# Altium footprint library ic.PcbLib: 116 footprints (part 1 of 8)
Each footprint in its own frame and in the unit in brackets; x right, y up, seen from the top. Pads: shape width x height; smd on the part's side, far side on the other; paste and mask are expansions set on the pad; w line width, h text height; cw(c..) or ccw(c..) is an arc to the next point about the centre after c.
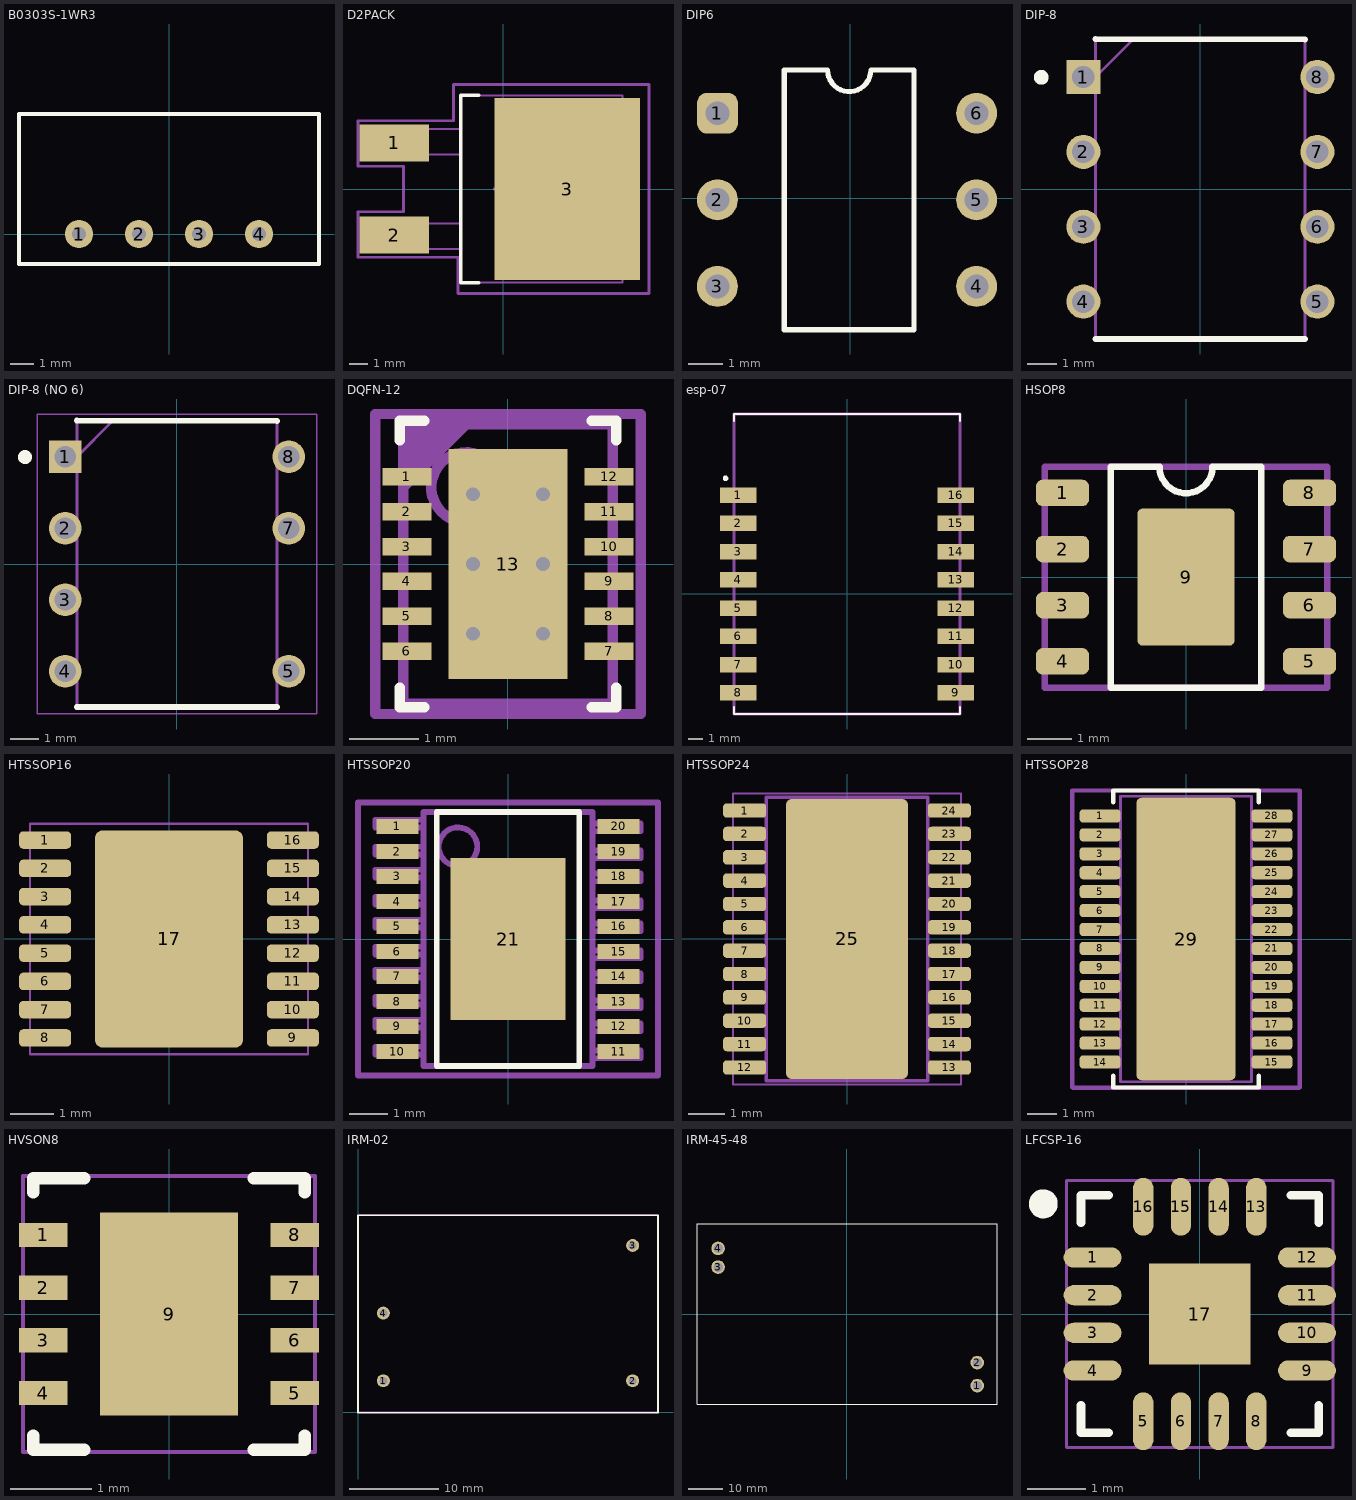
[diagram p0: the footprints below, top view; thin cyan lines are the x and y axes]

## B0303S-1WR3 [mm]
pads (4):
  round 1.2 hole 0.6: 1(-3.81,0) 2(-1.27,0) 3(1.27,0) 4(3.81,0)
Top Overlay:
  lines w0.15: -6.35,-1.27 6.35,-1.27 6.35,5.08 -6.35,5.08 -6.35,-1.27
3D body: height 10.2, standoff 0, extent -6.35,-1.27 6.35,5.08

## D2PACK [mm]
pads (3):
  rect 3.81x2.03 smd: 1(-6,2.54) 2(-6,-2.54)
  rect 8x10 smd: 3(3.5,0)
Top Overlay:
  lines w0.2: -1.35,-5.15 -2.35,-5.15 -2.35,5.15 -1.35,5.15
  text "." at -6.85,4.8 h0.1
Top Courtyard:
  lines w0.15: -8,-3.75 -8,-1.25 -5.5,-1.25 -5.5,1.25 -8,1.25 -8,3.75 -2.75,3.75 -2.75,5.75 8,5.75 8,-5.75 -2.5,-5.75 -2.5,-3.75 -8,-3.75
M15:
  lines w0.15: -0.5,0 0.5,0 ; 0,-0.5 0,0.5
Mechanical 29:
  lines w0.1: -2.35,-3.3 -6.9,-3.3 -6.9,-3 -6.9,-1.9 -2.35,-1.9 ; -2.35,1.9 -6.9,1.9 -6.9,2.2 -6.9,3.3 -2.35,3.3 ; -2.35,-5.15 6.55,-5.15 6.55,5.15 -2.35,5.15 -2.35,-5.15
  text ".Designator" at -1.25,-0.3 h1
3D body "D2-PAK.step": height 4.82, standoff 0, extent -7.405,-5.15 7.845,5.15

## DIP6 [mm]
pads (6):
  rrect50% 1.2x1.2 hole 0.7: 1(-3.9,2.5)
  round 1.2 hole 0.7: 2(-3.9,-0.04) 3(-3.9,-2.58) 4(3.7,-2.58) 5(3.7,-0.04) 6(3.7,2.5)
Top Overlay:
  lines w0.15: -1.941,-3.85 -1.941,3.77 -0.671,3.77 ccw(c-0.036,3.77) 0.599,3.77 1.869,3.77 1.869,-3.85 -1.941,-3.85
  text "." at -3.6,3.8 h0.1
3D body "User Library-DIP6.STEP": height 4.8, standoff -2.5, extent -4.035,-3.6 3.835,3.52

## DIP-8 [mm]
pads (8):
  rect 1.16x1.16 hole 0.76: 1(-3.97,3.81)
  round 1.16 hole 0.76: 2(-3.97,1.27) 3(-3.97,-1.27) 4(-3.97,-3.81) 5(3.97,-3.81) 6(3.97,-1.27) 7(3.97,1.27) 8(3.97,3.81)
Top Overlay:
  circle w0.25: c-5.4,3.8 r0.125
  lines w0.2: -3.555,-5.08 3.555,-5.08 ; -3.555,5.1 3.555,5.08
Mechanical 13:
  lines w0.1: -3.555,3.81 -2.285,5.08 ; -3.555,-5.08 -3.555,5.08 3.555,5.08 3.555,-5.08 -3.555,-5.08
3D body "ADM1485ANZ.stp": height 5.33, standoff -3.5, extent -4.11,-4.795 4.11,4.795

## DIP-8 (NO 6) [mm]
pads (7):
  rect 1.16x1.16 hole 0.76: 1(-3.97,3.81)
  round 1.16 hole 0.76: 2(-3.97,1.27) 3(-3.97,-1.27) 4(-3.97,-3.81) 5(3.97,-3.81) 7(3.97,1.27) 8(3.97,3.81)
Top Overlay:
  circle w0.25: c-5.4,3.8 r0.125
  lines w0.2: -3.555,-5.08 3.555,-5.08 ; -3.555,5.1 3.555,5.08
Mechanical 13:
  lines w0.1: -3.555,3.81 -2.285,5.08 ; -3.555,-5.08 3.555,-5.08 3.555,5.08 -3.555,5.08 -3.555,-5.08
M15:
  lines w0.05: -4.96,-5.33 4.96,-5.33 4.96,5.33 -4.96,5.33 -4.96,-5.33
3D body "ADM1485ANZ.stp": height 5.33, standoff -3.5, extent -4.11,-4.795 4.11,4.795

## DQFN-12 [mm] "SON, 12-Leads, Body 4x3mm, Pitch 0.5mm, Thermal Pad 3.3x1.7mm"
height 0.8
pads (13):
  rect 0.7x0.25 smd: 1(-1.45,1.25) 2(-1.45,0.75) 3(-1.45,0.25) 4(-1.45,-0.25) 5(-1.45,-0.75) 6(-1.45,-1.25) 7(1.45,-1.25) 8(1.45,-0.75) 9(1.45,-0.25) 10(1.45,0.25) 11(1.45,0.75) 12(1.45,1.25)
  rect 1.7x3.3 smd: 13(0,0)
via -0.5,1 diameter 0.5 hole 0.2
via 0.5,1 diameter 0.5 hole 0.2
via -0.5,0 diameter 0.5 hole 0.2
via 0.5,0 diameter 0.5 hole 0.2
via -0.5,-1 diameter 0.5 hole 0.2
via 0.5,-1 diameter 0.5 hole 0.2
Top Overlay:
  lines w0.15: -1.55,-1.775 -1.55,-2.05 -1.2,-2.05 ; -1.55,1.775 -1.55,2.05 -1.2,2.05 ; 1.2,-2.05 1.55,-2.05 1.55,-1.775 ; 1.2,2.05 1.55,2.05 1.55,1.775
  text "." at -2.032,1.943 h0.1
Top Courtyard:
  lines w0.15: -0.5,0 0.5,0 ; 0,-0.5 0,0.5 ; -1.9,-2.15 -1.9,2.15 1.9,2.15 1.9,-2.15 -1.9,-2.15
Mechanical 13:
  circle w0.15: c-0.6,1.1 r0.5
Mechanical 29:
  region: -1.5,1 -1.5,2 -0.5,2
  lines w0.15: -1.5,-2 -1.5,2 ; -1.5,-2 1.5,-2 ; -1.5,-2 1.5,-2 ; -1.5,-2 -1.5,2 ; -1.5,2 1.5,2 ; -1.5,2 1.5,2 ; 1.5,-2 1.5,2 ; 1.5,-2 1.5,2
  text ".Designator" at -1.4,-0.5 h1
3D body: height 0.8, standoff 0, extent -1.5,-2 1.5,2

## esp-07 [mm]
pads (16):
  rect 2.6x1.1 smd: 1(-7.7,7) 2(-7.7,5) 3(-7.7,3) 4(-7.7,1) 5(-7.7,-1) 6(-7.7,-3) 7(-7.7,-5) 8(-7.7,-7) 9(7.7,-7) 10(7.7,-5) 11(7.7,-3) 12(7.7,-1) 13(7.7,1) 14(7.7,3) 15(7.7,5) 16(7.7,7)
Top Overlay:
  lines w0.15: -8,-8 -8,-8.5 8,-8.5 8,-8 ; -8,12.25 -8,12.75 8,12.75 8,12.25
  lines w0.2: -8.6,8.1 cw(c-8.6,8.2) -8.6,8.3 ; -8.552,8.288 ccw(c-8.6,8.2) -8.5,8.2
Mechanical 13:
  lines w0.2: -8,-8.5 -8,12.75 8,12.75 8,-8.5 -8,-8.5
3D body "ESP8266-ESP07.STEP": height 2.2, standoff -0.01, extent -8,-8 8,12

## HSOP8 [mm]
pads (9):
  rrect50% 1.2x0.6 smd: 1(-2.794,1.905) 2(-2.794,0.635) 3(-2.794,-0.635) 4(-2.794,-1.905) 5(2.794,-1.905) 6(2.794,-0.635) 7(2.794,0.635) 8(2.794,1.905)
  rrect10% 2.2x3.1 smd: 9(0,0)
Top Overlay:
  lines w0.15: -1.7,-2.5 0,-2.5 1.7,-2.5 1.7,2.5 0.6,2.5 cw(c0,2.5) -0.6,2.5 -1.7,2.5 -1.7,-2.5
  text "." at -2.85,2.705 h0.1
Top Courtyard:
  lines w0.15: -3.2,-2.5 3.2,-2.5 3.2,2.5 -3.2,2.5 -3.2,-2.5
3D body "User Library-so8-4.STEP": height 1.76, standoff 0, extent -3.068,-2.445 3.068,2.445

## HTSSOP16 [mm] "TSOP, 16-Leads, Body 5,00x4,40mm, Pitch 0,65mm, Thermal Pad 5,00x3,40mm, IPC High Density"
height 1.2
pads (17):
  rrect50% 1.2x0.4 smd: 1(-2.85,2.275) 2(-2.85,1.625) 3(-2.85,0.975) 4(-2.85,0.325) 5(-2.85,-0.325) 6(-2.85,-0.975) 7(-2.85,-1.625) 8(-2.85,-2.275) 9(2.85,-2.275) 10(2.85,-1.625) 11(2.85,-0.975) 12(2.85,-0.325) 13(2.85,0.325) 14(2.85,0.975) 15(2.85,1.625) 16(2.85,2.275)
  rrect10% 3.4x5 smd mask+0.102: 17(0,0)
Top Overlay:
  text "." at -2.859,3.03 h0.1
Top Solder:
  rectangle: -1.5,-1.5 1.5,1.5
Top Courtyard:
  lines w0.05: -3.2,-2.65 -3.2,2.65 3.2,2.65 3.2,-2.65 -3.2,-2.65
3D body "HTSSOP16.step": height 1.2, standoff 0, extent -3.2,-2.55 3.2,2.55

## HTSSOP20 [mm] "TSSOP, 20-Leads, Body 6,50x4,40mm, Pitch 0,65mm, IPC Medium Density"
height 1.2
pads (21):
  rect 1.1x0.4 smd: 1(-2.875,2.925) 2(-2.875,2.275) 3(-2.875,1.625) 4(-2.875,0.975) 5(-2.875,0.325) 6(-2.875,-0.325) 7(-2.875,-0.975) 8(-2.875,-1.625) 9(-2.875,-2.275) 10(-2.875,-2.925) 11(2.875,-2.925) 12(2.875,-2.275) 13(2.875,-1.625) 14(2.875,-0.975) 15(2.875,-0.325) 16(2.875,0.325) 17(2.875,0.975) 18(2.875,1.625) 19(2.875,2.275) 20(2.875,2.925)
  rect 3x4.2 smd: 21(0,0)
Top Overlay:
  lines w0.15: -1.85,-3.3 1.85,-3.3 1.85,3.3 -1.85,3.3 -1.85,-3.3
  text "." at -2.921,3.721 h0.1
Top Courtyard:
  lines w0.15: -0.5,0 0.5,0 ; 0,-0.5 0,0.5 ; -3.9,-3.55 3.9,-3.55 3.9,3.55 -3.9,3.55 -3.9,-3.55
Mechanical 29:
  circle w0.15: c-1.3,2.4 r0.5
  lines w0.15: -2.2,-3 -3.45,-3 -3.45,-2.8 -2.2,-2.8 ; -2.2,-2.3 -3.45,-2.3 -3.45,-2.1 -2.2,-2.1 ; -2.2,-1.7 -3.45,-1.7 -3.45,-1.5 -2.2,-1.5 ; -2.2,-1 -3.45,-1 -3.45,-0.8 -2.2,-0.8 ; -2.2,-0.4 -3.45,-0.4 -3.45,-0.2 -2.2,-0.2 ; -2.2,0.3 -3.45,0.3 -3.45,0.5 -2.2,0.5 ; -2.2,0.9 -3.45,0.9 -3.45,1.1 -2.2,1.1 ; -2.2,1.6 -3.45,1.6 -3.45,1.8 -2.2,1.8 ; -2.2,2.2 -3.45,2.2 -3.45,2.4 -2.2,2.4 ; -2.2,2.9 -3.45,2.9 -3.45,3.1 -2.2,3.1 ; 2.2,-3.1 3.45,-3.1 3.45,-2.9 2.2,-2.9 ; 2.2,-2.4 3.45,-2.4 3.45,-2.2 2.2,-2.2 ; 2.2,-1.8 3.45,-1.8 3.45,-1.6 2.2,-1.6 ; 2.2,-1.1 3.45,-1.1 3.45,-0.9 2.2,-0.9 ; 2.2,-0.5 3.45,-0.5 3.45,-0.3 2.2,-0.3 ; 2.2,0.2 3.45,0.2 3.45,0.4 2.2,0.4 ; 2.2,0.8 3.45,0.8 3.45,1 2.2,1 ; 2.2,1.5 3.45,1.5 3.45,1.7 2.2,1.7 ; 2.2,2.1 3.45,2.1 3.45,2.3 2.2,2.3 ; 2.2,2.8 3.45,2.8 3.45,3 2.2,3 ; -2.2,-3.3 2.2,-3.3 2.2,3.3 -2.2,3.3 -2.2,-3.3
  text ".Designator" at -3.3,3.6 h1
3D body "TSSOP-20.step": height 1.2, standoff 0, extent -3.2,-3.3 3.2,3.3

## HTSSOP24 [mm] "TSOP, 24-Leads, Body 7,80x4,40mm, Pitch 0,65mm, Thermal Pad 7,80x3,40mm, IPC High Density"
height 1.2
pads (25):
  rrect50% 1.2x0.4 smd: 1(-2.85,3.575) 2(-2.85,2.925) 3(-2.85,2.275) 4(-2.85,1.625) 5(-2.85,0.975) 6(-2.85,0.325) 7(-2.85,-0.325) 8(-2.85,-0.975) 9(-2.85,-1.625) 10(-2.85,-2.275) 11(-2.85,-2.925) 12(-2.85,-3.575) 13(2.85,-3.575) 14(2.85,-2.925) 15(2.85,-2.275) 16(2.85,-1.625) 17(2.85,-0.975) 18(2.85,-0.325) 19(2.85,0.325) 20(2.85,0.975) 21(2.85,1.625) 22(2.85,2.275) 23(2.85,2.925) 24(2.85,3.575)
  rrect10% 3.4x7.8 smd mask+0: 25(0,0)
Top Overlay:
  text "." at -2.921,4.229 h0.1
Top Solder:
  rectangle: -1.2,-2.6 1.2,2.6
Top Courtyard:
  lines w0.05: -3.175,-4.05 3.175,-4.05 3.175,4.05 -3.175,4.05 -3.175,-4.05
Mechanical 13:
  lines w0.1: -2.25,-3.95 2.25,-3.95 2.25,3.95 -2.25,3.95 -2.25,-3.95
3D body "HTSSOP24.step": height 1.2, standoff 0, extent -3.2,-3.95 3.2,3.95

## HTSSOP28 [mm] "HTSSOP-28, 28-Leads, Body 9,70x4,40mm, Pitch 0,65mm, Thermal Pad 9,70x3,40mm, IPC Medium Density"
height 1.2
pads (29):
  rrect50% 1.4x0.45 smd: 1(-2.95,4.225) 2(-2.95,3.575) 3(-2.95,2.925) 4(-2.95,2.275) 5(-2.95,1.625) 6(-2.95,0.975) 7(-2.95,0.325) 8(-2.95,-0.325) 9(-2.95,-0.975) 10(-2.95,-1.625) 11(-2.95,-2.275) 12(-2.95,-2.925) 13(-2.95,-3.575) 14(-2.95,-4.225) 15(2.95,-4.225) 16(2.95,-3.575) 17(2.95,-2.925) 18(2.95,-2.275) 19(2.95,-1.625) 20(2.95,-0.975) 21(2.95,-0.325) 22(2.95,0.325) 23(2.95,0.975) 24(2.95,1.625) 25(2.95,2.275) 26(2.95,2.925) 27(2.95,3.575) 28(2.95,4.225)
  rrect10% 3.4x9.7 smd mask+0: 29(0,0)
Top Overlay:
  lines w0.15: -2.5,-4.7 -2.5,-5.1 2.5,-5.1 2.5,-4.7 ; -2.5,4.7 -2.5,5.1 2.5,5.1 2.5,4.7
  text "." at -3.048,4.991 h0.1
Top Solder:
  rectangle: -1.8,-2.6 1.8,2.6
Top Courtyard:
  lines w0.1: -2.25,-4.9 -2.25,4.9 2.25,4.9 2.25,-4.9 -2.25,-4.9
  lines w0.15: -0.8,0 0,0 ; -3.9,-5.1 3.9,-5.1 3.9,5.1 -3.9,5.1 -3.9,-5.1
Top 3D Body:
  lines w0.05: -3.9,-5.15 -3.9,5.15 3.9,5.15 3.9,-5.15 -3.9,-5.15
3D body "HTSSOP-28.step": height 1.2, standoff 0, extent -3.2,-4.9 3.2,4.9

## HVSON8 [mm] "SON, 8-Leads, Body 3,00x3,00mm, Pitch 0,65mm, Thermal Pad 3,00x2,60mm, IPC High Density"
height 1
pads (9):
  rect 0.6x0.3 smd: 1(-1.55,0.975) 2(-1.55,0.325) 3(-1.55,-0.325) 4(-1.55,-0.975) 5(1.55,-0.975) 6(1.55,-0.325) 7(1.55,0.325) 8(1.55,0.975)
  rect 1.7x2.5 smd paste-1.3: 9(0,0)
Top Overlay:
  lines w0.15: -1.675,-1.5 -1.675,-1.675 -1.045,-1.675 ; -1.675,1.5 -1.675,1.675 -1.045,1.675 ; 1.045,-1.675 1.675,-1.675 1.675,-1.5 ; 1.045,1.675 1.675,1.675 1.675,1.5
  text "." at -2.159,1.562 h0.1
Top Paste:
  rectangle: 0.1,-1.2 0.8,-0.1
  rectangle: 0.1,0.1 0.8,1.2
  rectangle: -0.8,-1.2 -0.1,-0.1
  rectangle: -0.8,0.1 -0.1,1.2
Top Courtyard:
  lines w0.05: -1.8,-1.7 1.8,-1.7 1.8,1.7 -1.8,1.7 -1.8,-1.7
  lines w0.1: -0.5,0 0.5,0 ; 0,-0.5 0,0.5
3D body "HVSON8.step": height 1, standoff 0, extent -1.6,-1.55 1.6,1.55

## IRM-02 [mm]
pads (4):
  round 1.45 hole 0.9: 1(2.85,3.527) 2(30.85,3.527) 3(30.85,18.727) 4(2.85,11.127)
Top Overlay:
  lines w0.2: 0,-0.073 0,22.127 33.7,22.127 33.7,-0.073 0,-0.073
Mechanical 13:
  lines w0.2: 33.7,-0.073 33.7,22.127 0,22.127 0,0 33.7,0
3D body "IRM-02-3.3.stp": height 15.52, standoff -5.78, extent 0,0 33.7,22.206

## IRM-45-48 [mm]
pads (4):
  round 4 hole 2.8 unplated: 1(38.2,-21) 2(38.2,-14.25) 3(-37.8,13.75) 4(-37.8,19.25)
Top Overlay:
  lines w0.15: -44,-26.5 44,-26.5 44,26.5 -44,26.5 -44,-26.5
3D body: height 0, standoff -3.5, extent 37.1,-22.1 39.3,-19.9
3D body: height 0, standoff -3.5, extent 37.1,-15.35 39.3,-13.15
3D body: height 0, standoff -3.5, extent -38.9,12.65 -36.7,14.85
3D body: height 29.5, standoff 0, extent -43.5,-26 43.5,26
3D body: height 0, standoff -3.5, extent -38.9,18.1 -36.7,20.3

## LFCSP-16 [mm] "LFCSP, 16-Leads, Body 4,00x4,00mm, Pitch 0,65mm, Thermal Pad 1,75x1,75mm, IPC Medium Density"
height 1.5
pads (17):
  oval 1x0.35 smd: 1(-1.85,0.975) 2(-1.85,0.325) 3(-1.85,-0.325) 4(-1.85,-0.975) 9(1.85,-0.975) 10(1.85,-0.325) 11(1.85,0.325) 12(1.85,0.975)
  oval 0.35x1 smd: 5(-0.975,-1.85) 6(-0.325,-1.85) 7(0.325,-1.85) 8(0.975,-1.85) 13(0.975,1.85) 14(0.325,1.85) 15(-0.325,1.85) 16(-0.975,1.85)
  rect 1.75x1.75 smd: 17(0,0)
Top Overlay:
  circle w0.25: c-2.7,1.9 r0.125
  lines w0.15: -2.05,-1.575 -2.05,-2.05 -1.575,-2.05 ; -2.05,1.575 -2.05,2.05 -1.575,2.05 ; 1.575,-2.05 2.05,-2.05 2.05,-1.575 ; 1.575,2.05 2.05,2.05 2.05,1.575
Top Courtyard:
  lines w0.05: -2.3,-2.3 2.3,-2.3 2.3,2.3 -2.3,2.3 -2.3,-2.3
  lines w0.1: -0.5,0 0.5,0 ; 0,-0.5 0,0.5
3D body "LFCSP-16.step": height 1.5, standoff 0, extent -2.05,-2.05 2.05,2.05